# Altium footprint library Xavier_NX_Carrier_Board_v1.1.PcbLib: 52 footprints (part 3 of 4)
Each footprint in its own frame and in the unit in brackets; x right, y up, seen from the top. Pads: shape width x height; smd on the part's side, far side on the other; paste and mask are expansions set on the pad; w line width, h text height; cw(c..) or ccw(c..) is an arc to the next point about the centre after c.
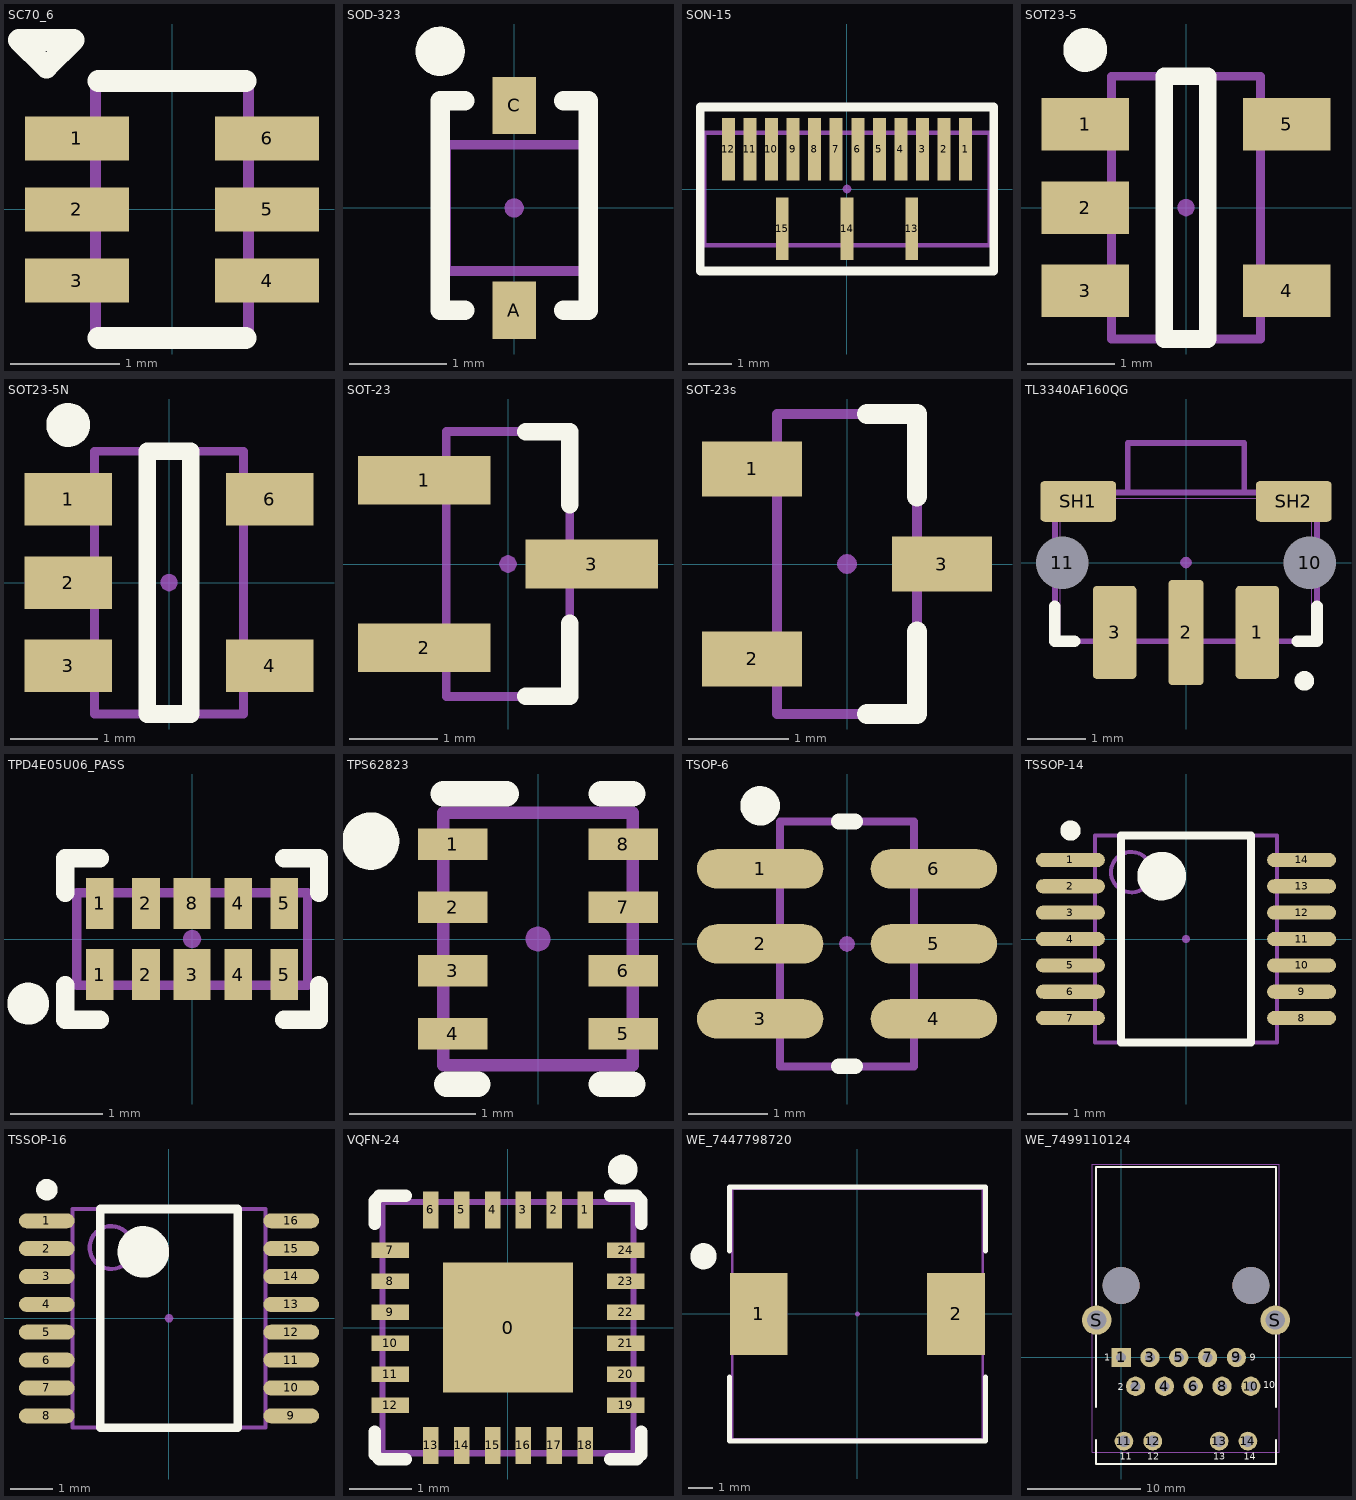
[diagram p2: the footprints below, top view; thin cyan lines are the x and y axes]

## SC70_6 [mm]
pads (6):
  rect 0.95x0.4 smd mask+0.05: 1(-0.87,0.65) 2(-0.87,0) 3(-0.87,-0.65) 4(0.87,-0.65) 5(0.87,0) 6(0.87,0.65)
Top Overlay:
  lines w0.2: -0.675,-1.175 0.675,-1.175 ; -0.675,1.175 0.675,1.175 ; -1.4,1.55 -1.15,1.3 -0.9,1.55 -1.4,1.55
Mechanical 4:
  lines w0.1: -0.7,-1.175 0.7,-1.175 0.7,1.175 -0.7,1.175 -0.7,-1.175
3D body "User Library-sot363.STEP": height 1, standoff 0, extent -1.175,-1.05 1.125,1.05

## SOD-323 [mm]
pads (3):
  rect 0.45x0.59 smd mask+0.05: A(0,-1.055) C(0,1.055)
  round 0.2 on Mech4: ""(0,0)
Top Overlay:
  circle w0.254: c-0.762,1.612 r0.127
  lines w0.2: -0.508,-1.055 -0.762,-1.055 -0.762,1.104 -0.508,1.104 ; 0.508,-1.055 0.762,-1.055 0.762,1.104 0.508,1.104
Mechanical 4:
  lines w0.1: -0.7,-0.65 -0.7,0.65 0.725,0.65 0.725,-0.65 -0.7,-0.65
3D body "SOD-323.step": height 1, standoff 0.01, extent -0.625,-1.25 0.625,1.25

## SON-15 [mm]
pads (16):
  rect 0.3x1.45 smd mask+0.05: 1(2.75,0.925) 2(2.25,0.925) 3(1.75,0.925) 4(1.25,0.925) 5(0.75,0.925) 6(0.25,0.925) 7(-0.25,0.925) 8(-0.75,0.925) 9(-1.25,0.925) 10(-1.75,0.925) 11(-2.25,0.925) 12(-2.75,0.925) 13(1.5,-0.925) 14(0,-0.925) 15(-1.5,-0.925)
  round 0.2 on Mech4: ""(0,0)
Top Overlay:
  lines w0.2: -3.4,-1.9 3.4,-1.9 3.4,1.9 -3.4,1.9 -3.4,-1.9
Mechanical 4:
  lines w0.1: -3.3,-1.3 -3.3,1.3 3.3,1.3 3.3,-1.3 -3.3,-1.3
3D body: height 0.8, standoff -0.01, extent -3.3,-1.3 3.3,1.3

## SOT23-5 [mm]
pads (6):
  rect 1x0.6 smd mask+0.05: 1(-1.15,0.95) 2(-1.15,0) 3(-1.15,-0.95) 4(1.15,-0.95) 5(1.15,0.95)
  round 0.2 on Mech4: ""(0,0)
Top Overlay:
  circle w0.25: c-1.15,1.8 r0.125
  lines w0.2: -0.25,-1.5 0.25,-1.5 0.25,1.5 -0.25,1.5 -0.25,-1.5
Mechanical 4:
  lines w0.1: -0.85,-1.5 -0.85,1.5 0.85,1.5 0.85,-1.5 -0.85,-1.5
3D body "User Library-SOT23-5-5.STEP": height 1.1, standoff 0, extent -1.19,-1.462 1.21,1.438

## SOT23-5N [mm]
pads (6):
  rect 1x0.6 smd mask+0.05: 1(-1.15,0.95) 2(-1.15,0) 3(-1.15,-0.95) 4(1.15,-0.95) 6(1.15,0.95)
  round 0.2 on Mech4: ""(0,0)
Top Overlay:
  circle w0.25: c-1.15,1.8 r0.125
  lines w0.2: -0.25,-1.5 -0.25,1.5 0.25,1.5 0.25,-1.5 -0.25,-1.5
Mechanical 4:
  lines w0.1: -0.85,-1.5 -0.85,1.5 0.85,1.5 0.85,-1.5 -0.85,-1.5
3D body "User Library-SOT23-5-5.STEP": height 1.1, standoff 0, extent -1.19,-1.462 1.21,1.438

## SOT-23 [mm]
pads (4):
  rect 1.5x0.55 smd mask+0.05: 1(-0.95,0.95) 2(-0.95,-0.95) 3(0.95,0)
  round 0.2 on Mech4: ""(0,0)
Top Overlay:
  lines w0.2: 0.2,-1.5 0.7,-1.5 0.7,-0.675 ; 0.2,1.5 0.7,1.5 0.7,0.675
Mechanical 4:
  lines w0.1: -0.7,-1.5 0.7,-1.5 0.7,1.5 -0.7,1.5 -0.7,-1.5
3D body "SOT23.STEP": height 1.21, standoff -0.01, extent -1.126,-1.5 1.126,1.5

## SOT-23s [mm]
pads (4):
  rect 1x0.55 smd mask+0.05: 1(-0.95,0.95) 2(-0.95,-0.95) 3(0.95,0)
  round 0.2 on Mech4: ""(0,0)
Top Overlay:
  lines w0.2: 0.2,-1.5 0.7,-1.5 0.7,-0.675 ; 0.2,1.5 0.7,1.5 0.7,0.675
Mechanical 4:
  lines w0.1: -0.7,-1.5 -0.7,1.5 0.7,1.5 0.7,-1.5 -0.7,-1.5
3D body "SOT23.STEP": height 1.21, standoff -0.01, extent -1.126,-1.5 1.126,1.5

## TL3340AF160QG [mm]
pads (8):
  rrect20% 0.75x1.6 smd mask+0.05: 1(1.225,-1.2) 3(-1.225,-1.2)
  rrect20% 0.6x1.8 smd mask+0.05: 2(0,-1.2)
  round 0.5 hole 0.9 mask+0.05: 10(2.125,0) 11(-2.125,0)
  rrect20% 1.3x0.7 smd mask+0.05: SH1(-1.85,1.05) SH2(1.85,1.05)
  round 0.2 on Mech4: ""(0,0)
Top Overlay:
  circle w0.254: c2.032,-2.032 r0.041
  lines w0.2: -2.255,-0.75 -2.255,-1.35 -1.915,-1.35 ; 1.91,-1.35 2.25,-1.35 2.25,-0.75
Mechanical 2:
  lines w0.001: -2.25,1.105 2.25,1.105 ; -2.155,-1.35 -2.155,1.2 ; -1,1.2 -1,2.05 1,2.05 1,1.2 ; 2,1.2 2.25,1.2 ; 2.155,-1.35 2.155,1.2 2.25,1.2 ; 2.155,-0.42 2.25,-0.42 ; 2.155,0.42 2.25,0.42 ; -2.25,1.2 -2,1.2 -2.25,1.2 ; -2.25,1.2 -2.25,-1.35 2.25,-1.35 2.25,1.2 ; -2.25,1.2 2.25,1.2
Mechanical 4:
  lines w0.1: -1,1.2 -1,2.05 1,2.05 1,1.2 ; -2.25,-1.35 2.25,-1.35 2.25,1.2 -2.25,1.2 -2.25,-1.35
3D body: height 3, standoff 2.4, extent 1.402,1.2 2,1.4
3D body: height 3, standoff 2.4, extent -2,1.2 -1.402,1.4
3D body: height 2.7, standoff 0.7, extent -0.996,1.201 0.996,2.051
3D body: height 3.3, standoff 0, extent -2.155,-1.35 2.155,1.105
3D body: height 3.3, standoff 0, extent -2.25,1.105 2.25,1.2
3D body: height 3.3, standoff 0, extent -2.25,-1.35 -2.155,1.105
3D body: height 3.3, standoff 0, extent 2.155,-1.35 2.25,1.105
3D body: height 0, standoff -0.45, extent 2.155,-0.42 2.25,0.42
3D body: height 0, standoff -0.45, extent -2.25,-0.42 -2.155,0.42

## TPD4E05U06_PASS [mm]
pads (11):
  rect 0.3x0.55 smd mask+0.05: 1(-1,-0.385) 1(-1,0.385) 2(-0.5,-0.385) 2(-0.5,0.385) 4(0.5,-0.385) 4(0.5,0.385) 5(1,-0.385) 5(1,0.385)
  rect 0.4x0.55 smd mask+0.05: 3(0,-0.385) 8(0,0.385)
  round 0.2 on Mech4: ""(0,0)
Top Overlay:
  circle w0.254: c-1.775,-0.7 r0.1
  lines w0.2: -1.375,-0.5 -1.375,-0.875 -1,-0.875 ; -1.375,0.5 -1.375,0.875 -1,0.875 ; 1,-0.875 1.375,-0.875 1.375,-0.5 ; 1,0.875 1.375,0.875 1.375,0.5
Mechanical 4:
  lines w0.1: -1.25,-0.5 -1.25,0.5 1.25,0.5 1.25,-0.5 -1.25,-0.5
3D body "UDFN10.STEP": height 0.56, standoff 0.01, extent -1.25,-0.5 1.25,0.51

## TPS62823 [mm]
pads (9):
  rect 0.55x0.25 smd mask+0.05: 1(-0.675,0.75) 2(-0.675,0.25) 3(-0.675,-0.25) 4(-0.675,-0.75) 5(0.675,-0.75) 6(0.675,-0.25) 7(0.675,0.25) 8(0.675,0.75)
  round 0.2 on Mech4: ""(0,0)
Top Overlay:
  circle w0.254: c-1.325,0.775 r0.1
  lines w0.2: -0.75,1.15 -0.25,1.15 ; -0.725,-1.15 -0.475,-1.15 ; 0.5,-1.15 0.75,-1.15 ; 0.5,1.15 0.75,1.15
Mechanical 4:
  lines w0.1: -0.75,-1 -0.75,1 0.75,1 0.75,-1 -0.75,-1
3D body: height 1.1, standoff 0, extent -0.762,-1.016 0.762,1.016

## TSOP-6 [mm]
pads (7):
  oval 1.6x0.5 smd mask+0.05: 1(-1.1,0.95) 2(-1.1,0) 3(-1.1,-0.95) 4(1.1,-0.95) 5(1.1,0) 6(1.1,0.95)
  round 0.2 on Mech4: ""(0,0)
Top Overlay:
  circle w0.25: c-1.1,1.75 r0.125
  lines w0.2: -0.1,-1.55 0.1,-1.55 ; -0.1,1.55 0.1,1.55
Mechanical 4:
  lines w0.1: -0.85,-1.55 0.85,-1.55 0.85,1.55 -0.85,1.55 -0.85,-1.55
3D body: height 1.1, standoff 0.05, extent -0.85,-1.55 0.85,1.55

## TSSOP-14 [mm]
pads (15):
  oval 1.7x0.35 smd mask+0.05: 1(-2.85,1.95) 2(-2.85,1.3) 3(-2.85,0.65) 4(-2.85,0) 5(-2.85,-0.65) 6(-2.85,-1.3) 7(-2.85,-1.95) 8(2.85,-1.95) 9(2.85,-1.3) 10(2.85,-0.65) 11(2.85,0) 12(2.85,0.65) 13(2.85,1.3) 14(2.85,1.95)
  round 0.2 on Mech4: ""(0,0)
Top Overlay:
  circle w0.6: c-0.6,1.55 r0.3
  circle w0.25: c-2.85,2.675 r0.125
  lines w0.2: -1.6,-2.55 1.6,-2.55 1.6,2.55 -1.6,2.55 -1.6,-2.55
Mechanical 4:
  circle w0.1: c-1.35,1.65 r0.5
  lines w0.1: -2.25,-2.55 2.25,-2.55 2.25,2.55 -2.25,2.55 -2.25,-2.55
3D body "User Library-TSSOP-14.STEP": height 1.21, standoff 0.01, extent -3.2,-2.5 3.2,2.5

## TSSOP-16 [mm]
pads (17):
  oval 1.3x0.35 smd mask+0.05: 1(-2.85,2.275) 2(-2.85,1.625) 3(-2.85,0.975) 4(-2.85,0.325) 5(-2.85,-0.325) 6(-2.85,-0.975) 7(-2.85,-1.625) 8(-2.85,-2.275) 9(2.85,-2.275) 10(2.85,-1.625) 11(2.85,-0.975) 12(2.85,-0.325) 13(2.85,0.325) 14(2.85,0.975) 15(2.85,1.625) 16(2.85,2.275)
  round 0.2 on Mech4: ""(0,0)
Top Overlay:
  circle w0.25: c-2.85,3 r0.125
  circle w0.6: c-0.6,1.55 r0.3
  lines w0.2: -1.6,-2.55 -1.6,2.55 1.6,2.55 1.6,-2.55 -1.6,-2.55
Mechanical 4:
  circle w0.1: c-1.35,1.65 r0.5
  lines w0.1: -2.25,-2.55 2.25,-2.55 2.25,2.55 -2.25,2.55 -2.25,-2.55
3D body "TSSOP-16.step": height 1.1, standoff 0, extent -3.2,-2.5 3.2,2.5

## VQFN-24 [mm]
pads (26):
  rect 2.1x2.1 smd mask+0.05: 0(0,0)
  rect 0.25x0.6 smd mask+0.05: 1(1.25,1.9) 2(0.75,1.9) 3(0.25,1.9) 4(-0.25,1.9) 5(-0.75,1.9) 6(-1.25,1.9) 13(-1.25,-1.9) 14(-0.75,-1.9) 15(-0.25,-1.9) 16(0.25,-1.9) 17(0.75,-1.9) 18(1.25,-1.9)
  rect 0.6x0.25 smd mask+0.05: 7(-1.9,1.25) 8(-1.9,0.75) 9(-1.9,0.25) 10(-1.9,-0.25) 11(-1.9,-0.75) 12(-1.9,-1.25) 19(1.9,-1.25) 20(1.9,-0.75) 21(1.9,-0.25) 22(1.9,0.25) 23(1.9,0.75) 24(1.9,1.25)
  round 0.2 on Mech4: ""(0,0)
Top Overlay:
  circle w0.3: c1.85,2.55 r0.09
  lines w0.2: -2.15,-1.675 -2.15,-2.05 -2.075,-2.125 -1.65,-2.125 ; -2.15,1.675 -2.15,2.05 -2.075,2.125 -1.65,2.125 ; 1.65,-2.125 2.075,-2.125 2.15,-2.05 2.15,-1.675 ; 1.65,2.125 2.075,2.125 2.15,2.05 2.15,1.675
Mechanical 4:
  lines w0.1: -2.025,-2.025 2.025,-2.025 2.025,2.025 -2.025,2.025 -2.025,-2.025
3D body "WQFN-24.step": height 0.8, standoff 0, extent -2.01,-2.01 2.01,2.01

## WE_7447798720 [mm]
pads (3):
  rect 2.4x3.4 smd mask+0.05: 1(-4.1,0) 2(4.1,0)
  round 0.2 on Mech4: ""(0,0)
Top Overlay:
  circle w0.55: c-6.4,2.4 r0.27
  lines w0.2: -5.325,-5.275 -5.325,-2.625 ; -5.325,2.625 -5.325,5.275 ; -5.275,-5.275 5.325,-5.275 5.325,-2.625 ; -5.275,5.275 5.325,5.275 5.325,2.625
Mechanical 4:
  lines w0.1: -5.2,-5.2 -5.2,5.2 5.2,5.2 5.2,-5.2 -5.2,-5.2
3D body "STEP-WE-PDF-1064-rev1.stp": height 6.35, standoff -0.05, extent -5.1,-5.1 5.1,5.1

## WE_7499110124 [mm]
pads (19):
  rect 1.7x1.7 hole 0.89 mask+0.05: 1(0,0)
  round 1.7 hole 0.89 mask+0.05: 2(1.27,-2.54) 3(2.54,0) 4(3.81,-2.54) 5(5.08,0) 6(6.35,-2.54) 7(7.62,0) 8(8.89,-2.54) 9(10.16,0) 10(11.43,-2.54)
  round 1.65 hole 1.02 mask+0.05: 11(0.246,-7.37) 12(2.786,-7.37) 13(8.636,-7.37) 14(11.176,-7.37)
  round 2.6 hole 1.7 mask+0.05: S(-2.163,3.3) S(13.593,3.3)
  round 0.2 on Mech4: ""(0,0)
  round 3.25 hole 3.25 unplated mask+0.05: ""(0,6.35) ""(11.43,6.35)
Top Overlay:
  lines w0.2: -2.225,-7.29 -2.225,-9.39 13.655,-9.39 13.655,-7.29 ; -2.21,-4.37 -2.21,16.79 13.64,16.79 13.64,-4.37
  text "1" at -1.485,-0.29 h0.6
  text "2" at -0.285,-2.89 h0.6
  text "9" at 11.315,-0.29 h0.6
  text "10" at 12.515,-2.69 h0.6
  text "11" at -0.127,-9.017 h0.6
  text "12" at 2.286,-9.017 h0.6
  text "13" at 8.128,-9.017 h0.6
  text "14" at 10.795,-9.017 h0.6
Mechanical 4:
  lines w0.1: -2.535,-8.34 13.94,-8.34 13.94,17.06 -2.535,17.06 -2.535,-8.34
3D body "7499110124 (rev1).stp": height 13.35, standoff -3.7, extent -2.485,-8.235 13.915,17.065